# Altium footprint library SparkFun.PCBLIB: 674 footprints (part 21 of 44)
Each footprint in its own frame and in the unit in brackets; x right, y up, seen from the top. Pads: shape width x height; smd on the part's side, far side on the other; paste and mask are expansions set on the pad; w line width, h text height; cw(c..) or ccw(c..) is an arc to the next point about the centre after c.
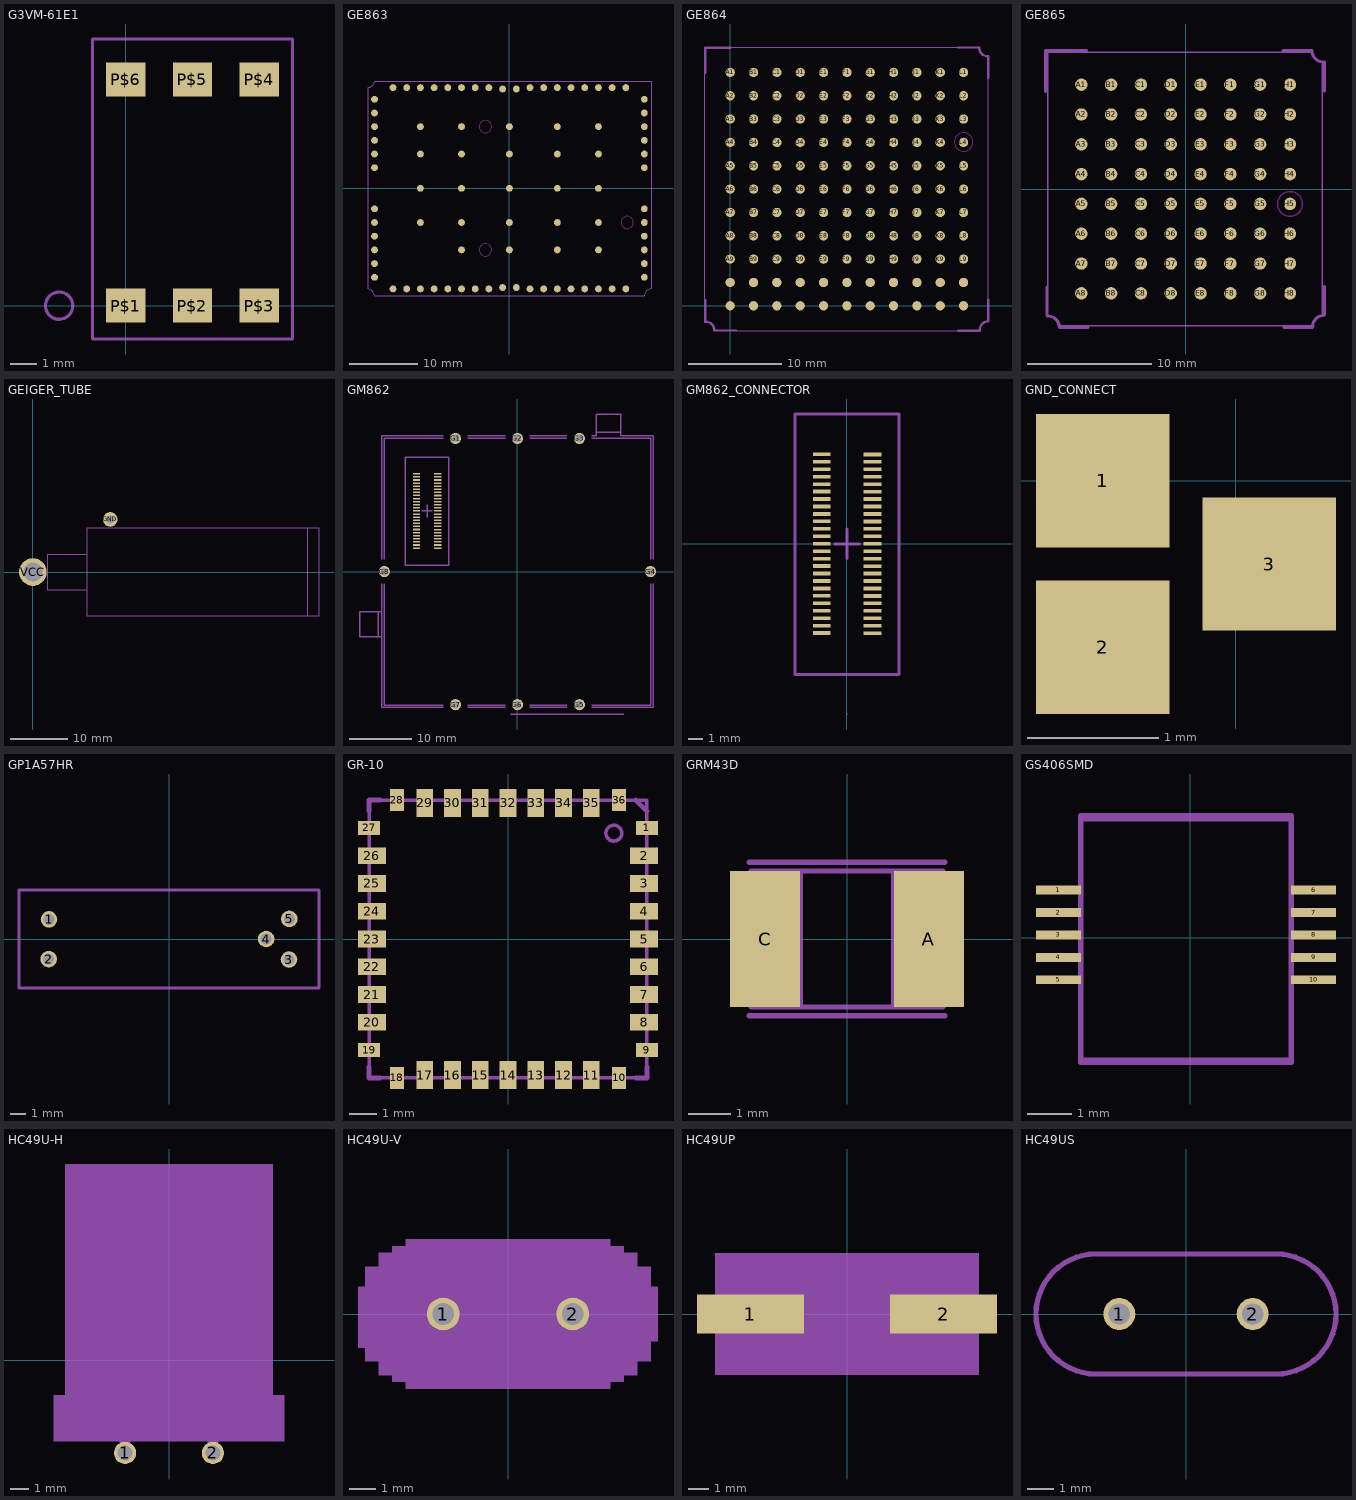
[diagram p20: the footprints below, top view; thin cyan lines are the x and y axes]

## G3VM-61E1 [mm]
pads (6):
  rect 1.5x1.3 smd: P$1(0,0) P$2(2.54,0) P$3(5.08,0) P$4(5.08,8.62) P$5(2.54,8.62) P$6(0,8.62)
Mechanical 2:
  circle w0.127: c-2.54,0 r0.519
  lines w0.127: -1.27,-1.27 -1.27,10.16 6.35,10.16 6.35,-1.27 -1.27,-1.27

## GE863 [mm]
pads (84):
  rrect100% 1x1 smd: 1(17,14.7) 2(15,14.7) 3(13,14.7) 4(11,14.7) 5(9,14.7) 6(7,14.7) 7(5,14.7) 8(3,14.7) 9(-3,14.7) 10(-5,14.7) 11(-7,14.7) 12(-9,14.7) 13(-11,14.7) 14(-13,14.7) 15(-15,14.7) 16(-17,14.7) 17(-19.7,13) 18(-19.7,11) 19(-19.7,9) 20(-19.7,7) 21(-19.7,5) 22(-19.7,3) 23(-19.7,-3) 24(-19.7,-5) 25(-19.7,-7) 26(-19.7,-9) 27(-19.7,-11) 28(-19.7,-13) 29(-17,-14.7) 30(-15,-14.7) 31(-13,-14.7) 32(-11,-14.7) 33(-9,-14.7) 34(-7,-14.7) 35(-5,-14.7) 36(-3,-14.7) 37(3,-14.7) 38(5,-14.7) 39(7,-14.7) 40(9,-14.7) 41(11,-14.7) 42(13,-14.7) 43(15,-14.7) 44(17,-14.7) 45(19.7,-13) 46(19.7,-11) 47(19.7,-9) 48(19.7,-7) 49(19.7,-5) 50(19.7,-3) 51(19.7,3) 52(19.7,5) 53(19.7,7) 54(19.7,9) 55(19.7,11) 56(19.7,13) 57(13,9) 58(7,9) 59(0,9) 60(-7,9) 61(-13,9) 62(13,5) 63(7,5) 64(0,5) 65(-7,5) 66(-13,5) 67(13,0) 68(7,0) 69(0,0) 70(-7,0) 71(-13,0) 72(13,-5) 73(7,-5) 74(0,-5) 75(-7,-5) 76(-13,-5) 77(13,-9) 78(7,-9) 79(0,-9) 80(-7,-9) 81(1,14.5) 82(-1,14.5) 83(-1,-14.5) 84(1,-14.5)
Keep-Out Layer:
  circle w0.127: c17.2,-5 r0.9
  circle w0.127: c-3.5,9 r0.9
  circle w0.127: c-3.5,-9 r0.9
Mechanical 2:
  lines w0.127: -20.7,-14.7 -20.7,14.7 ccw(c-20.785,15.8) -19.7,15.6 20.7,15.6 20.7,-14.7 ccw(c20.7,-15.7) 19.7,-15.7 -19.7,-15.7 ccw(c-20.9,-15.9) -20.7,-14.7

## GE864 [mm]
pads (121):
  rrect100% 1x1 smd: A1(0,25) A2(0,22.5) A3(0,20) A4(0,17.5) A5(0,15) A6(0,12.5) A7(0,10) A8(0,7.5) A9(0,5) A10(0,2.5) A11(0,0) B1(2.5,25) B2(2.5,22.5) B3(2.5,20) B4(2.5,17.5) B5(2.5,15) B6(2.5,12.5) B7(2.5,10) B8(2.5,7.5) B9(2.5,5) B10(2.5,2.5) B11(2.5,0) C1(5,25) C2(5,22.5) C3(5,20) C4(5,17.5) C5(5,15) C6(5,12.5) C7(5,10) C8(5,7.5) C9(5,5) C10(5,2.5) C11(5,0) D1(7.5,25) D2(7.5,22.5) D3(7.5,20) D4(7.5,17.5) D5(7.5,15) D6(7.5,12.5) D7(7.5,10) D8(7.5,7.5) D9(7.5,5) D10(7.5,2.5) D11(7.5,0) E1(10,25) E2(10,22.5) E3(10,20) E4(10,17.5) E5(10,15) E6(10,12.5) E7(10,10) E8(10,7.5) E9(10,5) E10(10,2.5) E11(10,0) F1(12.5,25) F2(12.5,22.5) F3(12.5,20) F4(12.5,17.5) F5(12.5,15) F6(12.5,12.5) F7(12.5,10) F8(12.5,7.5) F9(12.5,5) F10(12.5,2.5) F11(12.5,0) G1(15,25) G2(15,22.5) G3(15,20) G4(15,17.5) G5(15,15) G6(15,12.5) G7(15,10) G8(15,7.5) G9(15,5) G10(15,2.5) G11(15,0) H1(17.5,25) H2(17.5,22.5) H3(17.5,20) H4(17.5,17.5) H5(17.5,15) H6(17.5,12.5) H7(17.5,10) H8(17.5,7.5) H9(17.5,5) H10(17.5,2.5) H11(17.5,0) J1(20,25) J2(20,22.5) J3(20,20) J4(20,17.5) J5(20,15) J6(20,12.5) J7(20,10) J8(20,7.5) J9(20,5) J10(20,2.5) J11(20,0) K1(22.5,25) K2(22.5,22.5) K3(22.5,20) K4(22.5,17.5) K5(22.5,15) K6(22.5,12.5) K7(22.5,10) K8(22.5,7.5) K9(22.5,5) K10(22.5,2.5) K11(22.5,0) L1(25,25) L2(25,22.5) L3(25,20) L4(25,17.5) L6(25,12.5) L7(25,10) L8(25,7.5) L9(25,5) L10(25,2.5) L11(25,0)
  rrect100% 1x1 smd paste-0.5 mask-0.5: L5(25,15)
Keep-Out Layer:
  circle w0.127: c25,17.54 r1
Mechanical 2:
  lines w0.254: -2.692,-1.702 -2.692,0.61 ; -2.692,24.943 -2.692,27.635 0,27.635 ; -2.675,-1.706 cw(c-2.627,-2.632) -1.7,-2.631 ; -1.676,-2.642 0.61,-2.642 ; 24.359,27.661 26.645,27.661 ; 24.409,-2.667 26.721,-2.667 ; 26.668,27.65 ccw(c27.595,27.651) 27.644,26.725 ; 26.725,-2.65 cw(c27.651,-2.602) 27.65,-1.675 ; 27.661,-1.676 27.661,0.635 ; 27.661,24.409 27.661,26.721
Mechanical 18:
  lines w0.127: -2.7,-1.65 ccw(c-2.65,-1.65) -2.65,-1.7 cw(c-2.626,-2.626) -1.7,-2.65 26.7,-2.65 cw(c27.626,-2.626) 27.65,-1.7 27.65,26.7 cw(c27.626,27.626) 26.7,27.65 -2.7,27.65 -2.7,-1.65

## GE865 [mm]
pads (64):
  rrect100% 1x1 smd: A1(-8.4,8.4) A2(-8.4,6) A3(-8.4,3.6) A4(-8.4,1.2) A5(-8.4,-1.2) A6(-8.4,-3.6) A7(-8.4,-6) A8(-8.4,-8.4) B1(-6,8.4) B2(-6,6) B3(-6,3.6) B4(-6,1.2) B5(-6,-1.2) B6(-6,-3.6) B7(-6,-6) B8(-6,-8.4) C1(-3.6,8.4) C2(-3.6,6) C3(-3.6,3.6) C4(-3.6,1.2) C5(-3.6,-1.2) C6(-3.6,-3.6) C7(-3.6,-6) C8(-3.6,-8.4) D1(-1.2,8.4) D2(-1.2,6) D3(-1.2,3.6) D4(-1.2,1.2) D5(-1.2,-1.2) D6(-1.2,-3.6) D7(-1.2,-6) D8(-1.2,-8.4) E1(1.2,8.4) E2(1.2,6) E3(1.2,3.6) E4(1.2,1.2) E5(1.2,-1.2) E6(1.2,-3.6) E7(1.2,-6) E8(1.2,-8.4) F1(3.6,8.4) F2(3.6,6) F3(3.6,3.6) F4(3.6,1.2) F5(3.6,-1.2) F6(3.6,-3.6) F7(3.6,-6) F8(3.6,-8.4) G1(6,8.4) G2(6,6) G3(6,3.6) G4(6,1.2) G5(6,-1.2) G6(6,-3.6) G7(6,-6) G8(6,-8.4) H1(8.4,8.4) H2(8.4,6) H3(8.4,3.6) H5(8.4,-1.2) H6(8.4,-3.6) H7(8.4,-6) H8(8.4,-8.4)
  rrect100% 1x1 smd paste-0.5 mask-0.5: H4(8.4,1.2)
Keep-Out Layer:
  circle w0.127: c8.4,-1.2 r1
Mechanical 2:
  lines w0.254: -11.261,7.859 -11.261,11.155 ; -11.261,11.161 -8.009,11.161 ; -11.161,-10.221 -11.161,-7.909 ; -11.143,-10.225 cw(c-11.095,-11.151) -10.168,-11.15 ; -10.145,-11.161 -7.859,-11.161 ; 7.859,11.161 10.145,11.161 ; 7.909,-11.161 10.221,-11.161 ; 10.168,11.15 ccw(c11.095,11.151) 11.143,10.225 ; 10.225,-11.143 cw(c11.151,-11.095) 11.15,-10.168 ; 11.161,-10.145 11.161,-7.859 ; 11.161,7.909 11.161,10.221
Mechanical 18:
  lines w0.127: -11.1,-10.2 -11.1,11 10.178,11 ccw(c10.954,11) 10.994,10.225 ; -11.094,-10.225 cw(c-11.014,-11.038) -10.198,-11 10.2,-11 ; 10.225,-10.994 cw(c11,-10.954) 11,-10.178 11,10.22

## GEIGER_TUBE [mil]
pads (2):
  round 100 hole 55.12: GND(530,360)
  round 190 hole 130: VCC(0,0)
Mechanical 2:
  lines w5: 370,-120 370,120 ; 370,-120 370,-300 1880,-300 ; 370,-120 100,-120 100,120 370,120 ; 370,120 370,300 1880,300 ; 1880,-300 1960,-300 1960,300 1880,300 ; 1880,-300 1880,300

## GM862 [mil]
pads (58):
  rect 47.24x9.84 smd: 1(-507.8,149.25) 2(-641.67,149.39) 3(-507.8,168.94) 4(-641.67,169.07) 5(-507.8,188.62) 6(-641.67,188.76) 7(-507.8,208.31) 8(-641.67,208.44) 9(-507.8,227.99) 10(-641.67,228.13) 11(-507.85,247.62) 12(-641.67,247.81) 13(-507.8,267.36) 14(-641.67,267.5) 15(-507.8,287.05) 16(-641.67,287.18) 17(-507.8,306.73) 18(-641.67,306.87) 19(-507.8,326.42) 20(-641.67,326.55) 21(-507.8,346.1) 22(-641.67,346.24) 23(-507.8,365.79) 24(-641.67,365.92) 25(-507.8,385.47) 26(-641.67,385.61) 27(-507.8,405.16) 28(-641.67,405.29) 29(-507.8,424.84) 30(-641.67,424.98) 31(-507.8,444.53) 32(-641.67,444.66) 33(-507.8,464.21) 34(-641.67,464.35) 35(-507.8,483.9) 36(-641.67,484.03) 37(-507.8,503.58) 38(-641.67,503.72) 39(-507.8,523.27) 40(-641.67,523.4) 41(-507.8,542.95) 42(-641.67,543.09) 43(-507.8,562.64) 44(-641.67,562.77) 45(-507.8,582.32) 46(-641.67,582.46) 47(-507.8,602.01) 48(-641.67,602.14) 49(-507.8,621.69) 50(-641.67,621.83)
  round 70.86 hole 47.24: G1(-393.7,846.46) G2(0,846.46) G3(393.7,846.46) G4(846.46,0) G5(393.7,-846.46) G6(0,-846.46) G7(-393.7,-846.46) G8(-846.46,0)
Mechanical 2:
  lines w8: -864.17,-78.74 -864.17,-255.91 ; -864.17,78.74 -864.17,864.17 -472.44,864.17 ; -848.43,-78.74 -848.43,-848.43 -472.44,-848.43 ; -848.43,78.74 -848.43,848.43 -472.44,848.43 ; -608.2,385.47 -541.27,385.47 ; -574.73,346.1 -574.73,424.84 ; -472.44,-864.17 -864.17,-864.17 -864.17,-413.39 ; -314.96,-864.17 -78.74,-864.17 ; -314.96,-848.43 -78.74,-848.43 ; -314.96,848.43 -78.74,848.43 ; -314.96,864.17 -78.74,864.17 ; -43.31,-905.51 677.17,-905.51 ; 78.74,-864.17 314.96,-864.17 ; 78.74,-848.43 314.96,-848.43 ; 78.74,848.43 314.96,848.43 ; 78.74,864.17 314.96,864.17 ; 472.44,-864.17 864.17,-864.17 864.17,-78.74 ; 472.44,-848.43 848.43,-848.43 848.43,-78.74 ; 472.44,848.43 848.43,848.43 848.43,78.74 ; 472.44,864.17 500,864.17 500,885.83 ; 864.17,78.74 864.17,864.17 657.48,864.17 657.48,885.83 ; -885.83,-413.39 -1001.97,-413.39 -1001.97,-255.91 -885.83,-255.91 ; -885.83,-413.39 -864.17,-413.39 ; -885.83,-413.39 -885.83,-255.91 ; -885.83,-255.91 -864.17,-255.91 ; -864.17,-413.39 -864.17,-255.91 ; 500,885.83 500,1001.97 657.48,1001.97 657.48,885.83 ; 500,885.83 657.48,885.83 ; -712.6,39.47 -437.01,39.47 -437.01,728.45 -712.6,728.45 -712.6,39.47
Mechanical 18:
  lines w8: -864.17,-864.17 -864.17,-413.39

## GM862_CONNECTOR [mil]
pads (58):
  rect 47.24x9.84 smd: 1(67.2,-236.85) 2(-66.67,-236.72) 3(67.2,-217.17) 4(-66.67,-217.03) 5(67.2,-197.48) 6(-66.67,-197.35) 7(67.2,-177.8) 8(-66.67,-177.66) 9(67.2,-158.11) 10(-66.67,-157.98) 11(67.15,-138.48) 12(-66.67,-138.29) 13(67.2,-118.74) 14(-66.67,-118.61) 15(67.2,-99.06) 16(-66.67,-98.92) 17(67.2,-79.37) 18(-66.67,-79.24) 19(67.2,-59.69) 20(-66.67,-59.55) 21(67.2,-40) 22(-66.67,-39.87) 23(67.2,-20.32) 24(-66.67,-20.18) 25(67.2,-0.63) 26(-66.67,-0.5) 27(67.2,19.06) 28(-66.67,19.19) 29(67.2,38.74) 30(-66.67,38.87) 31(67.2,58.43) 32(-66.67,58.56) 33(67.2,78.11) 34(-66.67,78.24) 35(67.2,97.8) 36(-66.67,97.93) 37(67.2,117.48) 38(-66.67,117.61) 39(67.2,137.17) 40(-66.67,137.3) 41(67.2,156.85) 42(-66.67,156.98) 43(67.2,176.54) 44(-66.67,176.67) 45(67.2,196.22) 46(-66.67,196.35) 47(67.2,215.91) 48(-66.67,216.04) 49(67.2,235.59) 50(-66.67,235.72)
  round 1 hole 1: G1(0,-450) G2(0,-450) G3(0,-450) G4(0,-450) G5(0,-450) G6(0,-450) G7(0,-450) G8(0,-450)
Mechanical 2:
  lines w8: -33.2,-0.63 33.73,-0.63 ; 0.27,-40 0.27,38.74 ; -137.6,-346.63 137.99,-346.63 137.99,342.35 -137.6,342.35 -137.6,-346.63

## GND_CONNECT [mil]
pads (3):
  rect 40x40 smd: 1(-40,0) 2(-40,-50) 3(10,-25)

## GP1A57HR [mil]
pads (5):
  round 41.34 hole 27.56: 1(-299.21,48.82) 2(-300,-50) 3(299.21,-51.18) 4(242.13,0) 5(300,50)
Mechanical 2:
  lines w8: -374.02,-122.05 374.02,-122.05 374.02,122.05 -374.02,122.05 -374.02,-122.05

## GR-10 [mm]
pads (36):
  rect 0.8x0.5 smd: 1(5,4) 9(5,-4) 19(-5,-4) 27(-5,4)
  rect 1x0.6 smd: 2(4.9,3) 3(4.9,2) 4(4.9,1) 5(4.9,0) 6(4.9,-1) 7(4.9,-2) 8(4.9,-3) 20(-4.9,-3) 21(-4.9,-2) 22(-4.9,-1) 23(-4.9,0) 24(-4.9,1) 25(-4.9,2) 26(-4.9,3)
  rect 0.5x0.8 smd: 10(4,-5) 18(-4,-5) 28(-4,5) 36(4,5)
  rect 0.6x1 smd: 11(3,-4.9) 12(2,-4.9) 13(1,-4.9) 14(0,-4.9) 15(-1,-4.9) 16(-2,-4.9) 17(-3,-4.9) 29(-3,4.9) 30(-2,4.9) 31(-1,4.9) 32(0,4.9) 33(1,4.9) 34(2,4.9) 35(3,4.9)
Mechanical 2:
  lines w0.178: -5,-4.6 -5,-5 -4.6,-5 ; -5,4.6 -5,5 -4.6,5 ; 4.6,-5 5,-5 5,-4.6 ; 4.6,5 5,4.6
Mechanical 18:
  circle w0.127: c3.81,3.81 r0.284
  lines w0.127: -5,-5 5,-5 5,5 -5,5 -5,-5

## GRM43D [mm]
pads (2):
  rect 1.65x3.2 smd: A(1.927,0) C(-1.927,0)
Mechanical 2:
  lines w0.127: -2.3,-1.8 2.3,-1.8 ; -2.3,1.8 2.3,1.8
Mechanical 18:
  rectangle: -2.2,-1.6 -1.1,1.6
  rectangle: 1.1,-1.6 2.2,1.6
  lines w0.127: -1.1,-1.6 -2.25,-1.6 -2.25,1.6 -1.1,1.6 ; -1.1,-1.6 1.1,-1.6 ; -1.1,-1.6 -1.1,1.6 ; -1.1,1.6 1.1,1.6 ; 1.1,-1.6 2.25,-1.6 2.25,1.6 1.1,1.6 ; 1.1,-1.6 1.1,1.6

## GS406SMD [mm]
pads (10):
  rect 1x0.2 smd: 1(-2.94,1.06) 2(-2.94,0.56) 3(-2.94,0.06) 4(-2.94,-0.44) 5(-2.94,-0.94) 6(2.76,1.06) 7(2.76,0.56) 8(2.76,0.06) 9(2.76,-0.44) 10(2.76,-0.94)
Mechanical 1:
  lines w0.127: -2.44,-2.74 2.26,-2.74 2.26,2.66 -2.44,2.66 -2.44,-2.74
Mechanical 18:
  lines w0.127: -2.44,-2.78 2.26,-2.78 2.26,2.72 -2.44,2.72 -2.44,-2.78

## HC49U-H [mil]
pads (2):
  round 48 hole 32: 1(-95,-200) 2(95,-200)
Mechanical 2:
  lines w6: -200,-125 -200,365 cw(c-175,365) -175,390 175,390 cw(c175,365) 200,365 200,-125 ; -75,275 -37,275 ; 37,275 75,275
  lines w12: -37,225 -37,275 -37,325 ; 37,225 37,275 37,325 ; -13,225 -13,325 12,325 12,225 -13,225
  lines w32: -200,-125 200,-125
Mechanical 12:
  rectangle: -250,-175 250,-75
  rectangle: -225,-75 225,425
Mechanical 18:
  lines w24: -95,-200 -95,-130 ; 95,-200 95,-130

## HC49U-V [mil]
pads (2):
  round 48 hole 32: 1(-95,0) 2(95,0)
Mechanical 2:
  lines w6: -50,0 -25,0 ; -25,-35 -25,0 ; -25,35 -25,0 ; 25,-35 25,0 ; 25,35 25,0 ; 50,0 25,0 ; -115,-70 115,-70 ccw(c115,0) 115,70 -115,70 ccw(c-115,0) -115,-70 ; -10,-35 10,-35 10,35 -10,35 -10,-35
  lines w16: -115,-90 115,-90 ccw(c115,0) 115,90 -115,90 ccw(c-115,0) -115,-90
Mechanical 12:
  rectangle: -150,-110 150,110
  rectangle: -170,-100 -150,100
  rectangle: -190,-90 -170,90
  rectangle: -210,-70 -190,70
  rectangle: -220,-50 -210,40
  rectangle: 150,-100 170,100
  rectangle: 170,-90 190,90
  rectangle: 190,-70 210,70
  rectangle: 210,-40 220,40

## HC49UP [mil]
pads (2):
  rect 210x76 smd: 1(-190,0) 2(190,0)
Mechanical 2:
  lines w2: -201.15,-45 ccw(c-135,0) -135,-80 135,-80 ccw(c135,0) 201.14,-45 ; -201.15,45 cw(c-135,-0.01) -135,80 135,80 cw(c135,0) 201.15,45 ; -156.8,-45 ccw(c-135,0.01) -135,-50 135,-50 ccw(c135,0.01) 156.8,-45 ; -156.8,45 cw(c-135,-0.01) -135,50 135,50 cw(c135,-0.01) 156.8,45 ; -40,0 -25,0 ; 25,0 40,0
  lines w6: -225,-45 -225,-85 ccw(c-215,-85) -215,-95 215,-95 ccw(c215,-85) 225,-85 225,-45 ; -225,45 -225,85 cw(c-215,85) -215,95 215,95 cw(c215,85) 225,85 225,45 ; -25,-25 -25,0 -25,25 ; 25,-25 25,0 25,25 ; -10,-25 -10,25 10,25 10,-25 -10,-25
Mechanical 12:
  rectangle: -260,-120 260,120
Mechanical 18:
  lines w2: -201.15,-45 cw(c-135,0) -201.15,45 ; -156.8,-45 cw(c-135,0) -156.8,45 ; 156.8,-45 ccw(c135,0) 156.8,45 ; 201.15,-45 ccw(c135,0) 201.15,45
  lines w6: -225,-45 -225,-15 ; -225,45 -225,15 ; 225,-45 225,45 ; 225,-15 255,-15 255,15 225,15 ; -225,-15 -225,15 ; -225,-15 -255,-15 -255,15 -225,15

## HC49US [mil]
pads (2):
  round 48 hole 32: 1(-100,0) 2(100,0)
Mechanical 2:
  lines w8: -135,-90 135,-90 ccw(c135,0) 135,90 -135,90 ccw(c-135,0) -135,-90